# Altium footprint library cool_library.PcbLib: 1182 footprints (part 47 of 75)
Each footprint in its own frame and in the unit in brackets; x right, y up, seen from the top. Pads: shape width x height; smd on the part's side, far side on the other; paste and mask are expansions set on the pad; w line width, h text height; cw(c..) or ccw(c..) is an arc to the next point about the centre after c.
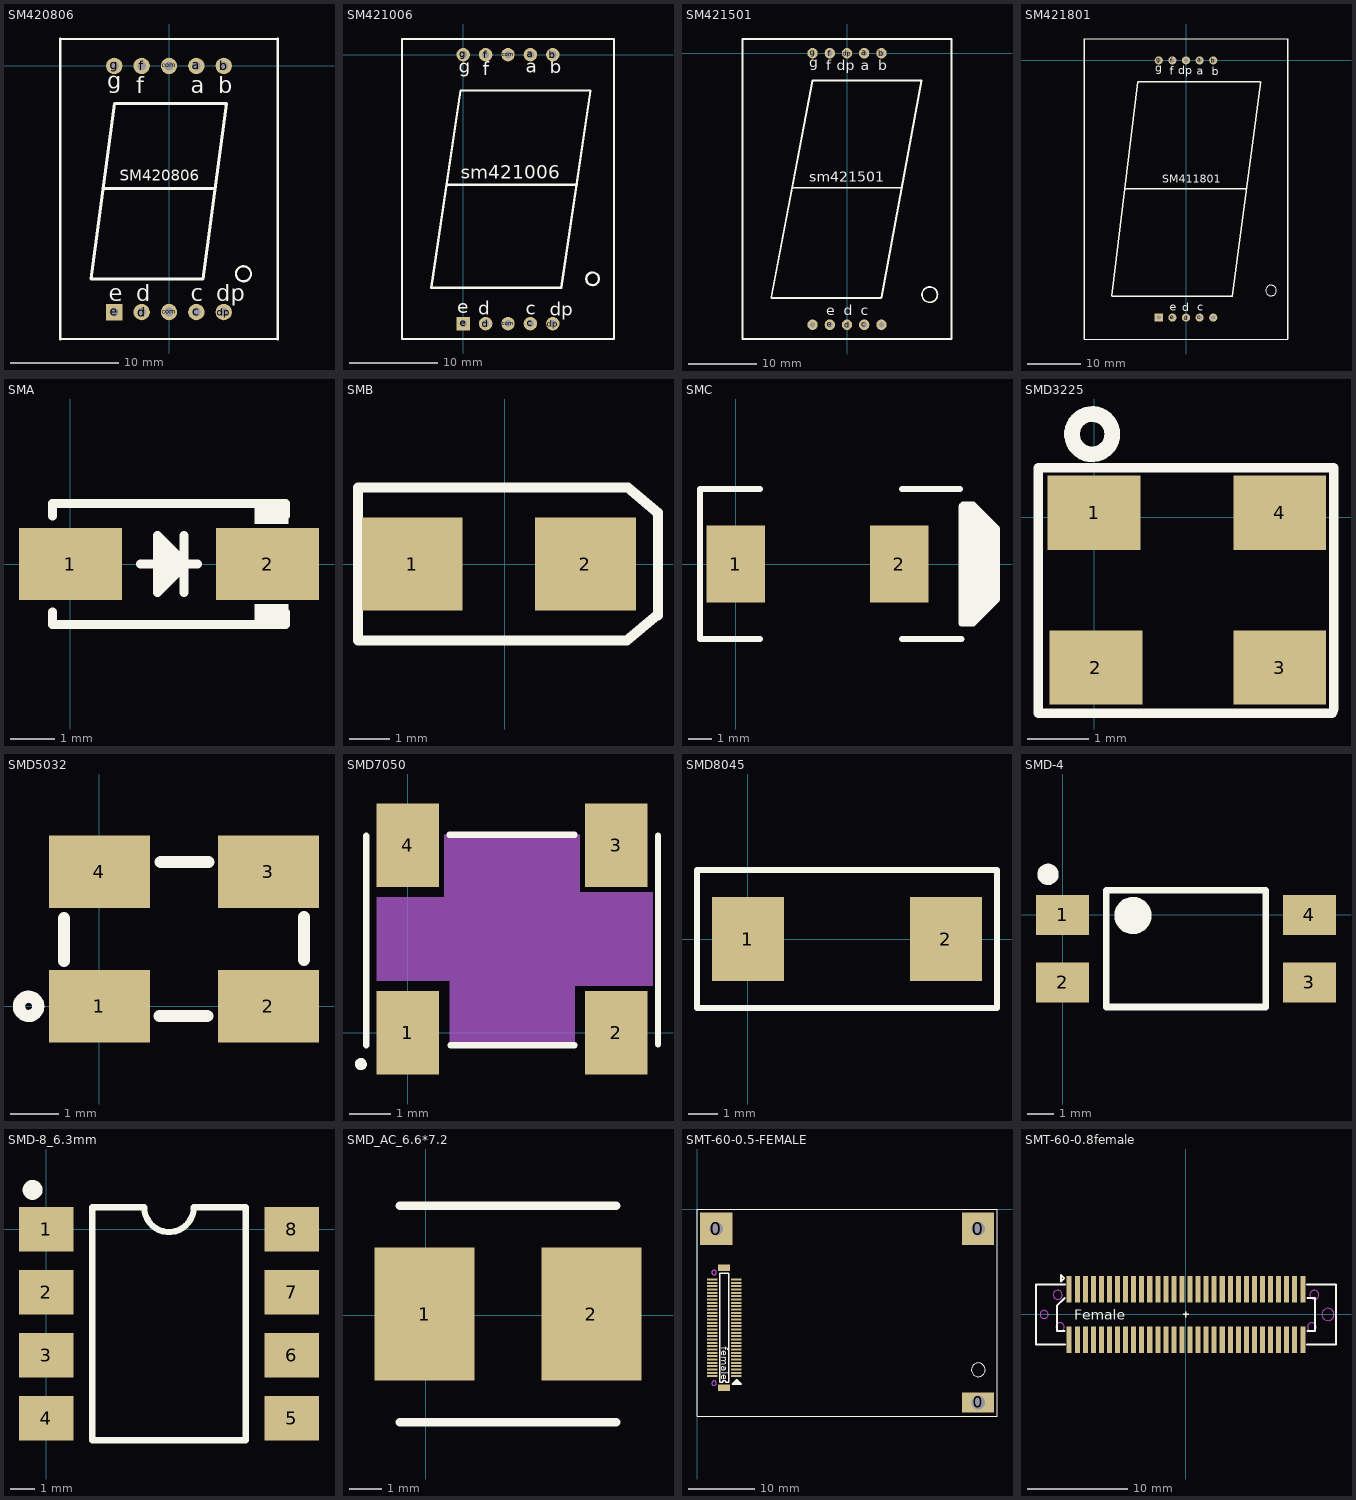
[diagram p46: the footprints below, top view; thin cyan lines are the x and y axes]

## SM420806 [mil]
pads (10):
  round 60 hole 32: a(100,0) b(200,0) c(100,-900) com(0,-900) com(0,0) d(-100,-900) dp(200,-900) f(-100,0) g(-200,0)
  rect 60x60 hole 32: e(-200,-900)
Top Overlay:
  circle w8: c272.44,-760 r27.56
  lines w8: -397.64,-998.42 397.64,-998.42 ; -397.64,98.42 397.64,98.42 ; -242.2,-444.37 -238.26,-448.31 ; 167.25,-448.31 171.19,-444.37
  lines w10: -397.64,-998.42 -397.64,98.42 ; -238.26,-448.31 167.25,-448.31 ; 397.64,-998.42 397.64,98.42 ; -285.5,-779.02 -198.89,-137.28 210.56,-137.28 123.94,-779.02 -285.5,-779.02
  text "d" at -120,-860 h60
  text "c" at 80,-860 h60
  text "dp" at 172,-861 h60
  text "e" at -220,-860 h60
  text "b" at 180,-100 h60
  text "a" at 80,-100 h60
  text "f" at -120,-100 h60
  text "g" at -225.87,-83.3 h60
  text "SM420806" at -180,-420 h40

## SM421006 [mil]
pads (10):
  round 60 hole 32: a(299.87,-0.44) b(399.87,-0.44) c(299.87,-1200.52) com(199.87,-1200.52) com(199.87,-0.44) d(99.87,-1200.52) dp(399.87,-1200.52) f(99.87,-0.44) g(-0.13,-0.44)
  rect 60x60 hole 32: e(-0.13,-1200.52)
Top Overlay:
  circle w10: c577.43,-1000.52 r28.28
  lines w10: -72.57,-580.52 507.43,-580.52 ; 199.87,69.48 -272.57,69.48 ; -272.57,69.48 -272.57,-1269.1 672.32,-1269.1 ; -272.57,69.48 672.32,69.48 ; 672.32,-1269.1 672.32,69.48 ; 672.31,-1269.1 672.31,69.48 ; -142.57,-1040.52 -12.57,-160.52 567.43,-160.52 437.43,-1040.52 -142.57,-1040.52
  text "sm421006" at -10,-555 h60
  text "d" at 68,-1162 h60
  text "c" at 278,-1160 h60
  text "dp" at 386,-1166 h60
  text "b" at 386,-84 h60
  text "a" at 280,-82 h60
  text "f" at 88,-92 h60
  text "g" at -20,-80 h60
  text "e" at -26,-1154 h60

## SM421501 [mil]
pads (10):
  round 60 hole 31.5: a(100,0) b(200,0) c(100,-1574.8) com(-200,-1574.8) com(200,-1574.8) d(0,-1574.8) dp(0,0) e(-100,-1574.8) f(-100,0) g(-200,0)
Top Overlay:
  circle w10: c480,-1400 r44.72
  lines w10: -440.07,-1417.32 -200,-157.48 432.22,-157.48 200,-1417.32 ; -440,-1420 197.32,-1420 ; -312.99,-780 320,-780 ; -606.3,-1657.48 606.3,-1657.48 606.3,82.68 -606.3,82.68 -606.3,-1657.48
  text "b" at 180,-100 h60
  text "a" at 80,-100 h60
  text "dp" at -60,-100 h60
  text "e" at -120,-1520 h60
  text "d" at -20,-1520 h60
  text "c" at 80,-1520 h60
  text "g" at -220,-80 h60
  text "f" at -120,-100 h60
  text "sm421501" at -220,-745 h60

## SM421801 [mil]
pads (10):
  round 60 hole 32: a(100,0) b(200,0) c(100,-1889.76) com(200,-1889.76) d(0,-1889.76) dp(0,0) e(-100,-1889.76) f(-100,0) g(-200,0)
  rect 60x60 hole 32: com(-200,-1889.76)
Top Overlay:
  circle w8: c624.63,-1691 r39.37
  lines w8: -748.03,-2047.24 748.03,-2047.24 ; -748.03,157.48 748.03,157.48
  lines w10: -748.03,-2047.24 -748.03,157.48 ; -545,-1732.28 342.52,-1732.28 ; -545,-1728 -355.02,-157.48 544.2,-157.48 ; -451,-943 445,-943 ; 341.23,-1732.28 549,-157.48 ; 748.03,-2047.24 748.03,157.48
  text "SM411801" at -175,-900 h59.05
  text "d" at -27,-1843 h60
  text "c" at 83,-1838 h60
  text "dp" at -58,-100 h60
  text "e" at -121,-1838 h60
  text "b" at 188,-110 h60
  text "a" at 78,-105 h60
  text "f" at -121,-105 h60
  text "g" at -226,-84 h60

## SMA [mm]
height 8.23
pads (2):
  rect 2.3x1.6 smd: 1(0,0) 2(4.4,0)
Top Overlay:
  rectangle: 4.105,-1.35 4.867,-0.889
  rectangle: 4.105,0.889 4.867,1.35
  region: 1.946,0.635 1.946,-0.635 2.581,0
  lines w0.2: -0.4,-1.076 -0.4,-1.35 4.8,-1.35 4.8,-1.083 ; -0.4,1.076 -0.4,1.35 4.8,1.35 4.8,1.083 ; 1.565,0 2.835,0 ; 2.54,-0.635 2.54,0.635 ; 1.946,-0.635 1.946,0.635 2.581,0 1.946,-0.635

## SMB [mm]
pads (2):
  rect 2.5x2.3 smd: 1(-2.3,0) 2(2,0)
Top Overlay:
  lines w0.254: 3.783,-1.27 3.023,-1.902 -1.041,-1.902 -3.649,-1.902 -3.649,1.902 -0.965,1.902 3.048,1.902 3.801,1.27 3.801,-1.27

## SMC [mm]
pads (2):
  rect 2.5x3.3 smd: 1(0,0) 2(7,0)
Top Overlay:
  rectangle: 10.033,2.286 10.332,2.368
  rectangle: 10.344,1.975 10.552,2.148
  rectangle: 10.668,1.685 10.937,1.763
  rectangle: 10.611,1.708 10.798,1.902
  rectangle: 10.668,1.27 11.015,1.685
  rectangle: 10.541,-1.905 10.795,-1.397
  rectangle: 10.287,1.27 10.668,2.032
  rectangle: 9.906,-2.286 10.541,-1.397
  rectangle: 10.033,1.397 10.414,2.286
  rectangle: 10.16,-1.524 11.176,1.524
  rectangle: 9.652,-2.54 10.16,2.54
  lines w0.254: -1.524,-3.2 -1.524,3.2 ; -1.499,-3.2 1.041,-3.2 ; -1.499,3.2 1.041,3.2 ; 7.112,-3.2 9.652,-3.2 ; 7.112,3.2 9.601,3.2 ; 10.033,2.286 10.922,1.397 ; 10.922,-1.524 10.16,-2.286 10.16,-2.54 ; 10.16,-2.54 11.176,-1.524 11.176,1.524 ; 10.16,-2.54 9.652,-2.54 9.652,2.464 9.728,2.54 10.16,2.54 ; 10.16,2.54 11.176,1.524 ; 10.16,2.54 11.176,1.524

## SMD3225 [mm]
pads (4):
  rect 1.5x1.2 smd: 1(0,0.076) 2(0.03,-2.424) 3(3,-2.424) 4(3,0.076)
Top Overlay:
  circle w0.254: c-0.031,1.346 r0.325
  lines w0.152: -0.9,-3.164 -0.9,0.806 3.85,0.806 ; -0.89,-3.164 3.85,-3.164 3.87,-3.084 3.87,0.806

## SMD5032 [mm]
pads (4):
  rect 2.1x1.5 smd: 1(0,0) 2(3.505,0) 3(3.505,2.794) 4(0,2.794)
Top Overlay:
  circle w0.254: c-1.47,0 r0.2
  lines w0.254: -0.737,0.94 -0.737,1.829 ; 1.245,-0.203 2.235,-0.203 ; 1.27,2.997 2.261,2.997 ; 4.242,0.965 4.242,1.854

## SMD7050 [mil]
height 52.36
pads (4):
  rect 60x80 smd: 1(0,0) 2(200,0) 3(200,180) 4(0,180)
Top Overlay:
  lines w6: -43,-28 ccw(c-45,-30) -42.17,-30 ; -40,-12 -40,189 ; 40,190 160,190 ; 41,-12 160,-12 ; 240,-11 240,189
Mechanical 1:
  pour cut-out: -30,130 -30,50 40,50 40,-11 160,-11 160,45 235,45 235,135 165,135 165,190 35,190 35,130
3D body: height 59.8, standoff 6.69, extent -30,-8 233,184
3D body: height 59.06, standoff 6.69, extent -38,-13 240,190

## SMD8045 [mm]
pads (2):
  rect 2.4x2.8 smd: 1(0,0) 2(6.6,0)
Top Overlay:
  lines w0.203: -1.7,-2.3 -1.7,2.3 8.253,2.3 ; -1.653,-2.3 8.3,-2.3 8.3,2.3

## SMD-4 [mm]
height 8.23
pads (4):
  rect 2x1.5 smd: 1(0,0) 2(0,-2.54) 3(9.3,-2.54) 4(9.3,0)
Top Overlay:
  circle w0.7: c2.65,-0.02 r0.35
  circle w0.4: c-0.55,1.53 r0.2
  lines w0.254: 1.65,-3.47 7.65,-3.47 7.65,0.93 1.65,0.93 1.65,-3.47

## SMD-8_6.3mm [mm]
height 8.23
pads (8):
  rect 2.2x1.8 smd: 1(0,0) 2(0,-2.54) 3(0,-5.08) 4(0,-7.62) 5(9.9,-7.62) 6(9.9,-5.08) 7(9.9,-2.54) 8(9.9,0)
Top Overlay:
  circle w0.4: c-0.55,1.59 r0.2
  lines w0.254: 1.85,-8.51 8.05,-8.51 8.05,0.89 5.95,0.89 cw(c4.95,0.89) 3.95,0.89 1.85,0.89 1.85,-8.51

## SMD_AC_6.6*7.2 [mm]
pads (2):
  rect 3.04x4.06 smd: 1(-0.033,0.043) 2(5.047,0.043)
Top Overlay:
  lines w0.254: -0.795,-3.259 5.809,-3.259 ; -0.795,3.345 5.809,3.345

## SMT-60-0.5-FEMALE [mm]
pads (65):
  rect 4.826x4.826 hole 2.032: 0(2.89,-2.9) 0(42.16,-2.9)
  rect 1.8x1 smd: 0(4.07,-26.76) 0(4.07,-8.76)
  rect 4.826x3.048 hole 2.032: 0(42.16,-28.96)
  rect 1.6x0.3 smd: 1(5.87,-25.01) 2(2.27,-25.01) 3(5.87,-24.51) 4(2.27,-24.51) 5(5.87,-24.01) 6(2.27,-24.01) 7(5.87,-23.51) 8(2.27,-23.51) 9(5.87,-23.01) 10(2.27,-23.01) 11(5.87,-22.51) 12(2.27,-22.51) 13(5.87,-22.01) 14(2.27,-22.01) 15(5.87,-21.51) 16(2.27,-21.51) 17(5.87,-21.01) 18(2.27,-21.01) 19(5.87,-20.51) 20(2.27,-20.51) 21(5.87,-20.01) 22(2.27,-20.01) 23(5.87,-19.51) 24(2.27,-19.51) 25(5.87,-19.01) 26(2.27,-19.01) 27(5.87,-18.51) 28(2.27,-18.51) 29(5.87,-18.01) 30(2.27,-18.01) 31(5.87,-17.51) 32(2.27,-17.51) 33(5.87,-17.01) 34(2.27,-17.01) 35(5.87,-16.51) 36(2.27,-16.51) 37(5.87,-16.01) 38(2.27,-16.01) 39(5.87,-15.51) 40(2.27,-15.51) 41(5.87,-15.01) 42(2.27,-15.01) 43(5.87,-14.51) 44(2.27,-14.51) 45(5.87,-14.01) 46(2.27,-14.01) 47(5.87,-13.51) 48(2.27,-13.51) 49(5.87,-13.01) 50(2.27,-13.01) 51(5.87,-12.51) 52(2.27,-12.51) 53(5.87,-12.01) 54(2.27,-12.01) 55(5.87,-11.51) 56(2.27,-11.51) 57(5.87,-11.01) 58(2.27,-11.01) 59(5.87,-10.51) 60(2.27,-10.51)
Top Overlay:
  circle w0.152: c42.192,-24.058 r1.025
  lines w0.127: 0,-31 45,-31 45,0 0,0 0,-31
  lines w0.2: 3.417,-25.942 3.813,-25.942 cw(c4.082,-25.942) 4.35,-25.942 4.747,-25.942 4.747,-9.607 3.417,-9.607 3.417,-25.942
  lines w0.229: 5.506,-26.001 6.444,-26.001 ; 5.72,-25.787 6.23,-25.787 ; 5.289,-26.218 5.975,-25.532 6.661,-26.218 5.289,-26.218
  text "female" at 3.658,-20.599 h1.02
Keep-Out Layer:
  circle w0.127: c2.57,-9.46 r0.35
  circle w0.127: c2.57,-26.06 r0.35
Mechanical 1:
  circle w0.127: c2.57,-26.06 r0.35
  circle w0.127: c2.57,-9.46 r0.35

## SMT-60-0.8female [mm] "Male"
height 7
pads (60):
  rect 0.5x2.6 smd: 1(-11.6,2.505) 2(-11.6,-2.505) 3(-10.8,2.505) 4(-10.8,-2.505) 5(-10,2.505) 6(-10,-2.505) 7(-9.2,2.505) 8(-9.2,-2.505) 9(-8.4,2.505) 10(-8.4,-2.505) 11(-7.6,2.505) 12(-7.6,-2.505) 13(-6.8,2.505) 14(-6.8,-2.505) 15(-6,2.505) 16(-6,-2.505) 17(-5.2,2.505) 18(-5.2,-2.505) 19(-4.4,2.505) 20(-4.4,-2.505) 21(-3.6,2.505) 22(-3.6,-2.505) 23(-2.8,2.505) 24(-2.8,-2.505) 25(-2,2.505) 26(-2,-2.505) 27(-1.2,2.505) 28(-1.2,-2.505) 29(-0.4,2.505) 30(-0.4,-2.505) 31(0.4,2.505) 32(0.4,-2.505) 33(1.2,2.505) 34(1.2,-2.505) 35(2,2.505) 36(2,-2.505) 37(2.8,2.505) 38(2.8,-2.505) 39(3.6,2.505) 40(3.6,-2.505) 41(4.4,2.505) 42(4.4,-2.505) 43(5.2,2.505) 44(5.2,-2.505) 45(6,2.505) 46(6,-2.505) 47(6.8,2.505) 48(6.8,-2.505) 49(7.6,2.505) 50(7.6,-2.505) 51(8.4,2.505) 52(8.4,-2.505) 53(9.2,2.505) 54(9.2,-2.505) 55(10,2.505) 56(10,-2.505) 57(10.8,2.505) 58(10.8,-2.505) 59(11.6,2.505) 60(11.6,-2.505)
Top Overlay:
  lines w0.127: -0.254,0 0.254,0 ; 0,-0.254 0,0.254
  lines w0.203: -12.066,-1.626 -12.828,-1.626 -12.828,0.864 -12.066,1.626 ; -12,-3 -14.9,-3 -14.9,3 -12,3 ; 12,-3 14.9,-3 14.9,3 12,3 ; 12.066,-1.626 12.828,-1.626 12.828,1.626 12.066,1.626 ; -12.402,3.298 -12.1,3.6 -12.402,3.902 -12.402,3.298
  text "Female" at -11.1,-0.5 h1.02
Keep-Out Layer:
  circle w0.1: c-12.75,1.95 r0.45
  circle w0.1: c-14.1,0 r0.4
  circle w0.1: c-12.5,-1.25 r0.425
  circle w0.1: c12.5,-1.25 r0.425
  circle w0.1: c14.1,0 r0.6
  circle w0.1: c12.75,1.95 r0.45
Mechanical 1:
  circle w0.1: c-12.75,1.95 r0.45
  circle w0.1: c-14.1,0 r0.4
  circle w0.1: c-12.5,-1.25 r0.425
  circle w0.1: c12.5,-1.25 r0.425
  circle w0.1: c14.1,0 r0.6
  circle w0.1: c12.75,1.95 r0.45